# Altium footprint library UBISWITCH_REV_A_MODULE.PcbLib: 1 footprints
Each footprint in its own frame and in the unit in brackets; x right, y up, seen from the top. Pads: shape width x height; smd on the part's side, far side on the other; paste and mask are expansions set on the pad; w line width, h text height; cw(c..) or ccw(c..) is an arc to the next point about the centre after c.
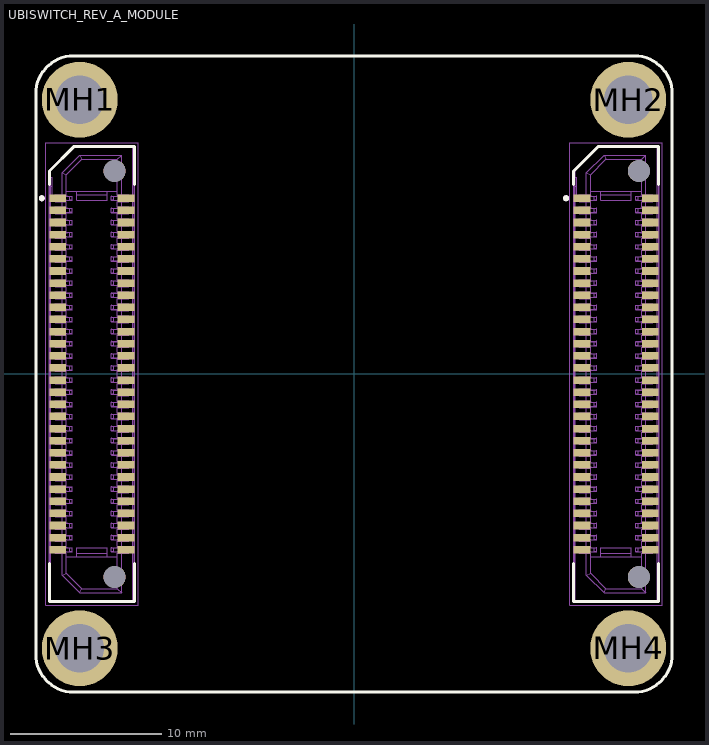
[diagram p0: the footprint, top view; thin cyan lines are the x and y axes]

## UBISWITCH_REV_A_MODULE [mm]
pads (128):
  rect 1.1x0.5 smd: J1_1(-19.55,11.6) J1_2(-15.05,11.6) J1_3(-19.55,10.8) J1_4(-15.05,10.8) J1_5(-19.55,10) J1_6(-15.05,10) J1_7(-19.55,9.2) J1_8(-15.05,9.2) J1_9(-19.55,8.4) J1_10(-15.05,8.4) J1_11(-19.55,7.6) J1_12(-15.05,7.6) J1_13(-19.55,6.8) J1_14(-15.05,6.8) J1_15(-19.55,6) J1_16(-15.05,6) J1_17(-19.55,5.2) J1_18(-15.05,5.2) J1_19(-19.55,4.4) J1_20(-15.05,4.4) J1_21(-19.55,3.6) J1_22(-15.05,3.6) J1_23(-19.55,2.8) J1_24(-15.05,2.8) J1_25(-19.55,2) J1_26(-15.05,2) J1_27(-19.55,1.2) J1_28(-15.05,1.2) J1_29(-19.55,0.4) J1_30(-15.05,0.4) J1_31(-19.55,-0.4) J1_32(-15.05,-0.4) J1_33(-19.55,-1.2) J1_34(-15.05,-1.2) J1_35(-19.55,-2) J1_36(-15.05,-2) J1_37(-19.55,-2.8) J1_38(-15.05,-2.8) J1_39(-19.55,-3.6) J1_40(-15.05,-3.6) J1_41(-19.55,-4.4) J1_42(-15.05,-4.4) J1_43(-19.55,-5.2) J1_44(-15.05,-5.2) J1_45(-19.55,-6) J1_46(-15.05,-6) J1_47(-19.55,-6.8) J1_48(-15.05,-6.8) J1_49(-19.55,-7.6) J1_50(-15.05,-7.6) J1_51(-19.55,-8.4) J1_52(-15.05,-8.4) J1_53(-19.55,-9.2) J1_54(-15.05,-9.2) J1_55(-19.55,-10) J1_56(-15.05,-10) J1_57(-19.55,-10.8) J1_58(-15.05,-10.8) J1_59(-19.55,-11.6) J1_60(-15.05,-11.6) J2_1(15.05,11.6) J2_2(19.55,11.6) J2_3(15.05,10.8) J2_4(19.55,10.8) J2_5(15.05,10) J2_6(19.55,10) J2_7(15.05,9.2) J2_8(19.55,9.2) J2_9(15.05,8.4) J2_10(19.55,8.4) J2_11(15.05,7.6) J2_12(19.55,7.6) J2_13(15.05,6.8) J2_14(19.55,6.8) J2_15(15.05,6) J2_16(19.55,6) J2_17(15.05,5.2) J2_18(19.55,5.2) J2_19(15.05,4.4) J2_20(19.55,4.4) J2_21(15.05,3.6) J2_22(19.55,3.6) J2_23(15.05,2.8) J2_24(19.55,2.8) J2_25(15.05,2) J2_26(19.55,2) J2_27(15.05,1.2) J2_28(19.55,1.2) J2_29(15.05,0.4) J2_30(19.55,0.4) J2_31(15.05,-0.4) J2_32(19.55,-0.4) J2_33(15.05,-1.2) J2_34(19.55,-1.2) J2_35(15.05,-2) J2_36(19.55,-2) J2_37(15.05,-2.8) J2_38(19.55,-2.8) J2_39(15.05,-3.6) J2_40(19.55,-3.6) J2_41(15.05,-4.4) J2_42(19.55,-4.4) J2_43(15.05,-5.2) J2_44(19.55,-5.2) J2_45(15.05,-6) J2_46(19.55,-6) J2_47(15.05,-6.8) J2_48(19.55,-6.8) J2_49(15.05,-7.6) J2_50(19.55,-7.6) J2_51(15.05,-8.4) J2_52(19.55,-8.4) J2_53(15.05,-9.2) J2_54(19.55,-9.2) J2_55(15.05,-10) J2_56(19.55,-10) J2_57(15.05,-10.8) J2_58(19.55,-10.8) J2_59(15.05,-11.6) J2_60(19.55,-11.6)
  round 5 hole 3.2: MH1(-18.1,18.1) MH2(18.1,18.1) MH3(-18.1,-18.1) MH4(18.1,-18.1)
  round 1.45 hole 1.45 unplated: ""(-15.8,-13.4) ""(-15.8,13.4) ""(18.8,-13.4) ""(18.8,13.4)
Top Overlay:
  circle w0.2: c-20.606,11.6 r0.1
  circle w0.2: c13.994,11.6 r0.1
  lines w0.2: -20.1,-12.5 -20.1,-15 -14.5,-15 -14.5,-12.5 ; -20.1,12.5 -20.1,13.4 -18.5,15 -14.5,15 -14.5,12.5 ; 14.5,-12.5 14.5,-15 20.1,-15 20.1,-12.5 ; 14.5,12.5 14.5,13.4 16.1,15 20.1,15 20.1,12.5 ; -21,-18.5 ccw(c-18.5,-18.5) -18.5,-21 18.5,-21 ccw(c18.5,-18.5) 21,-18.5 21,18.5 ccw(c18.5,18.5) 18.5,21 -18.5,21 ccw(c-18.5,18.5) -21,18.5 -21,-18.5
Mechanical 2:
  drawing of 8362 lines, arcs and shapes, not listed
Mechanical 13:
  circle w0.2: c-20.606,11.6 r0.1
  circle w0.2: c13.994,11.6 r0.1
  lines w0.1: -20.1,-15 -20.1,13.4 -18.5,15 -14.5,15 -14.5,-15 -20.1,-15 ; 14.5,-15 20.1,-15 20.1,15 16.1,15 14.5,13.4 14.5,-15
Mechanical 15:
  lines w0.05: -20.35,-15.25 -20.35,15.25 -14.25,15.25 -14.25,-15.25 -20.35,-15.25 ; 14.25,-15.25 20.35,-15.25 20.35,15.25 14.25,15.25 14.25,-15.25
3D body "CONNECTORS_MODULE.STEP": height 10.81, standoff -1.04, extent -21.209,-21 20.791,21